# Altium footprint library myPcbLib.PcbLib: 987 footprints (part 3 of 62)
Each footprint in its own frame and in the unit in brackets; x right, y up, seen from the top. Pads: shape width x height; smd on the part's side, far side on the other; paste and mask are expansions set on the pad; w line width, h text height; cw(c..) or ccw(c..) is an arc to the next point about the centre after c.
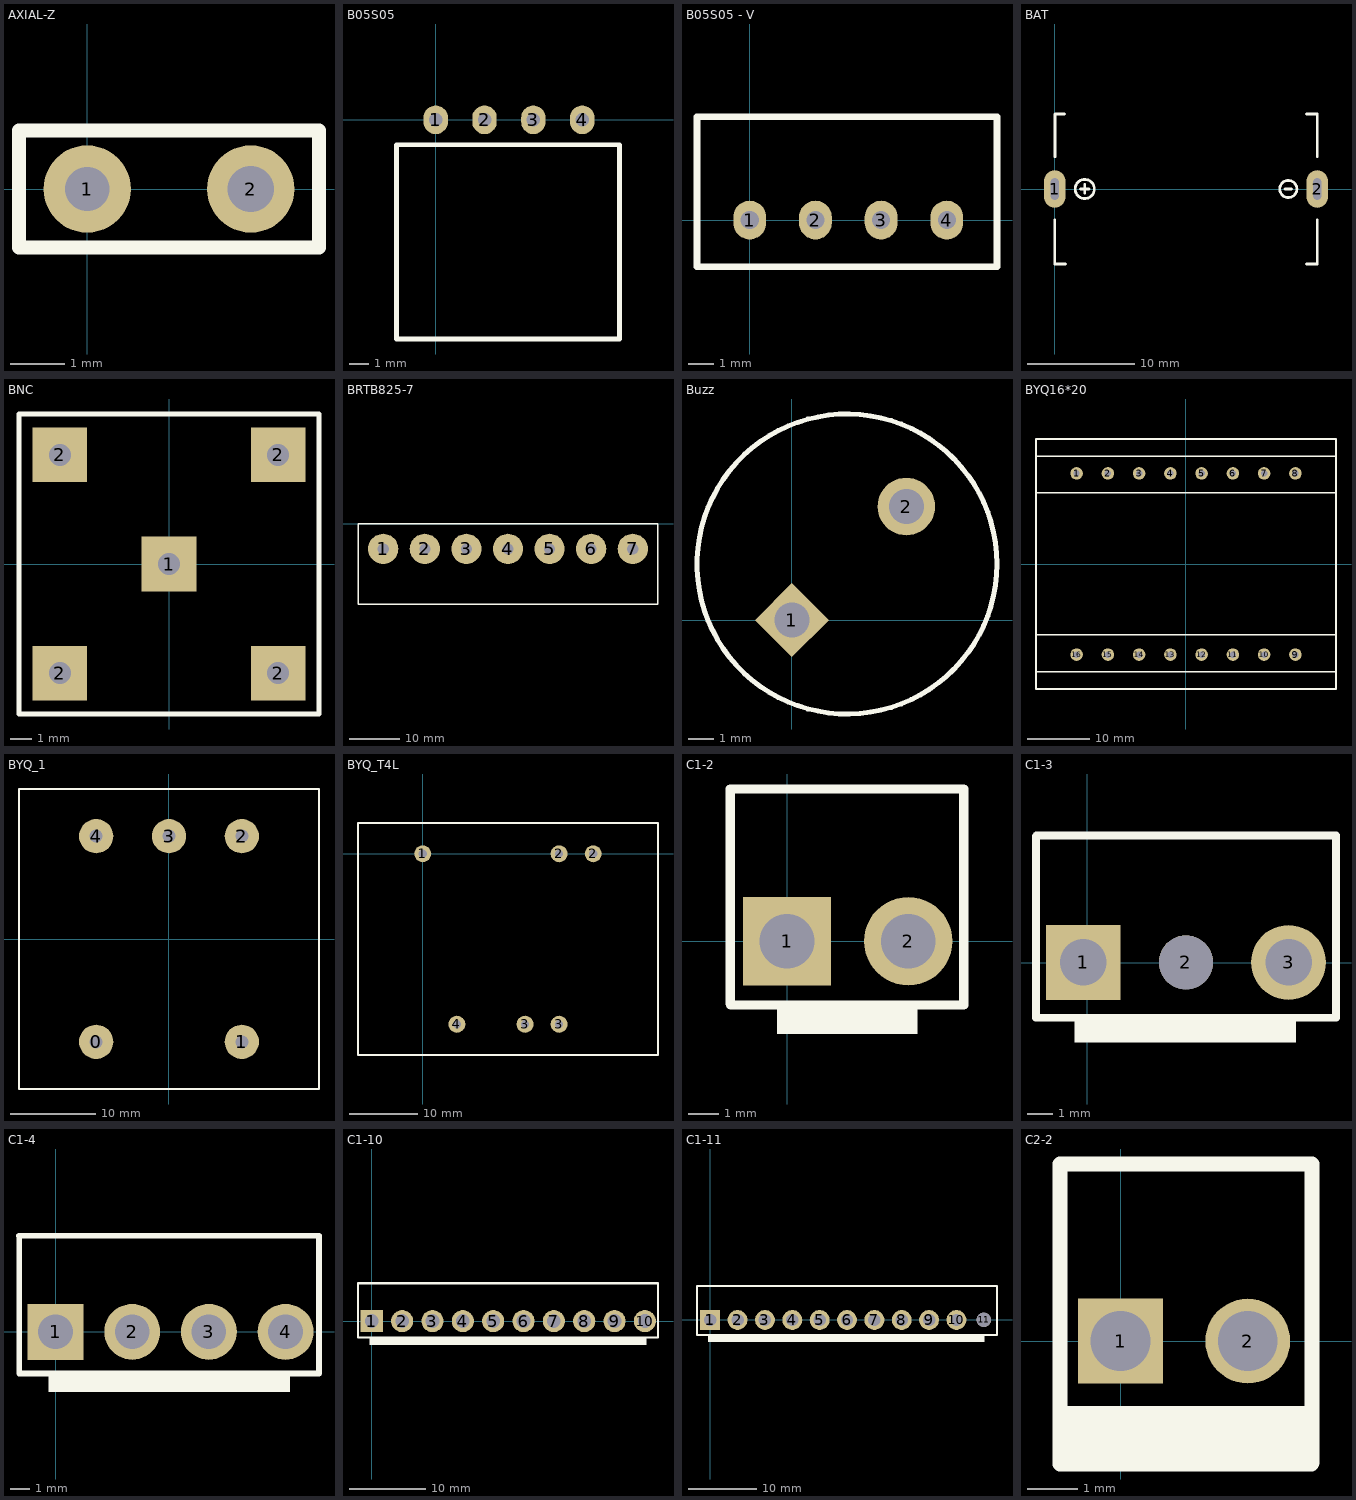
[diagram p2: the footprints below, top view; thin cyan lines are the x and y axes]

## AXIAL-Z [mm]
pads (2):
  round 1.6 hole 0.813: 1(0,0)
  round 1.6 hole 0.85: 2(3,0)
Top Overlay:
  lines w0.254: -1.25,-1.075 4.25,-1.075 4.25,1.075 -1.25,1.075 -1.25,-1.075

## B05S05 [mm]
height 8.2
pads (4):
  oval 1.27x1.5 hole 0.7: 1(0,0) 2(2.54,0) 3(5.08,0) 4(7.62,0)
Top Overlay:
  lines w0.254: -2.04,-11.4 9.56,-11.4 9.56,-1.3 -2.04,-1.3 -2.04,-11.4

## B05S05 - V [mm]
height 8.2
pads (4):
  oval 1.27x1.5 hole 0.7: 1(0,0) 2(2.54,0) 3(5.08,0) 4(7.62,0)
Top Overlay:
  lines w0.254: -2.04,-1.8 9.56,-1.8 9.56,4 -2.04,4 -2.04,-1.8

## BAT [mm]
pads (2):
  oval 2x3.5 hole 0.75 slot 2 at 90 deg: 1(0,0) 2(24.5,0)
Top Overlay:
  circle w0.254: c2.8,0 r0.894
  circle w0.254: c21.8,0 r0.8
  lines w0.254: 0,-2.9 0,-7 1,-7 ; 0.014,3.014 0.014,6.286 0.014,7 0.9,7 ; 2.4,0 3.2,0 ; 2.8,-0.386 2.8,0.414 ; 21.5,0 22.1,0 ; 23.5,-7 24.5,-7 24.5,-2.9 ; 23.5,7 24.5,7 24.5,3

## BNC [mil]
pads (5):
  rect 100x100 hole 40: 1(0,0) 2(-200,-200) 2(-200,200) 2(200,-200) 2(200,200)
Top Overlay:
  lines w10: -275,-275 275,-275 275,275 -275,275 -275,-275

## BRTB825-7 [mm]
height 13
pads (7):
  round 6 hole 2.2: 1(15,-5) 2(23.25,-5) 3(31.5,-5) 4(39.75,-5) 5(48,-5) 6(56.25,-5) 7(64.5,-5)
Top Overlay:
  lines w0.254: 10,-16 69.5,-16 69.5,0 10,0 10,-16

## Buzz [mm]
pads (2):
  rect 2.1x2.1 hole 1.4 rot 45: 1(0,0)
  round 2.3 hole 1.4: 2(4.572,4.54)
Top Overlay:
  circle w0.2: c2.201,2.244 r5.994

## BYQ16*20 [mm]
height 36
pads (16):
  round 2 hole 1: 1(-17.5,14.5) 2(-12.5,14.5) 3(-7.5,14.5) 4(-2.5,14.5) 5(2.5,14.5) 6(7.5,14.5) 7(12.5,14.5) 8(17.5,14.5) 9(17.5,-14.5) 10(12.5,-14.5) 11(7.5,-14.5) 12(2.5,-14.5) 13(-2.5,-14.5) 14(-7.5,-14.5) 15(-12.5,-14.5) 16(-17.5,-14.5)
Top Overlay:
  lines w0.254: -24,-17.272 23.873,-17.272 ; -24,11.43 23.873,11.43 ; -24,17.272 23.873,17.272 ; -23.873,-11.303 24,-11.303 ; -24,-20 -24,20 24,20 24,-20 -24,-20

## BYQ_1 [mm]
height 30
pads (5):
  round 4 hole 1.5: 0(-8.5,-12) 1(8.5,-12) 2(8.5,12) 3(0,12) 4(-8.5,12)
Top Overlay:
  lines w0.254: -17.5,-17.5 -17.5,17.5 17.5,17.5 17.5,-17.5 -17.5,-17.5

## BYQ_T4L [mm]
pads (6):
  round 2.5 hole 1.2: 1(0,0) 2(20,0) 2(25,0) 3(15,-25) 3(20,-25) 4(5,-25)
Top Overlay:
  lines w0.254: -9.5,-29.5 -9.5,0 -9.5,4.5 -5.5,4.5 34.5,4.5 34.5,-0.5 34.5,-29.5 25,-29.5 -9.5,-29.5

## C1-2 [mm]
pads (2):
  rect 2.9x2.9 hole 1.8: 1(0,0)
  round 2.9 hole 1.8: 2(3.98,0)
Top Overlay:
  region: 4.286,-3.048 4.286,-2.043 -0.328,-2.043 -0.328,-3.048
  lines w0.305: -1.863,-2.053 -1.863,4.995 5.8,4.995 5.8,-2.095 -1.852,-2.095

## C1-3 [mm]
pads (3):
  rect 2.9x2.9 hole 1.8: 1(-0.15,0.023)
  round 2.1 hole 2.1: 2(3.83,0.023)
  round 2.9 hole 1.8: 3(7.81,0.023)
Top Overlay:
  rectangle: -0.491,-3.076 8.092,-2.144
  lines w0.305: -1.983,4.915 -1.983,-2.123 9.648,-2.123 9.648,4.936 -1.962,4.936

## C1-4 [mm]
pads (4):
  rect 2.9x2.9 hole 1.8: 1(0,0)
  round 2.9 hole 1.8: 2(3.98,0) 3(7.96,0) 4(11.94,0)
Top Overlay:
  rectangle: -0.37,-3.133 12.181,-2.148
  lines w0.305: -1.894,4.985 13.674,4.985 13.674,-2.159 -1.884,-2.159 -1.884,4.889

## C1-10 [mm]
pads (10):
  rect 2.9x2.9 hole 1.8: 1(0,0)
  round 2.9 hole 1.8: 2(3.98,0) 3(7.96,0) 4(11.94,0) 5(15.92,0) 6(19.9,0) 7(23.88,0) 8(27.86,0) 9(31.84,0) 10(35.82,0)
Top Overlay:
  rectangle: -0.275,-3.122 36.015,-2.148
  lines w0.305: -1.81,4.911 -1.81,-2.148 37.539,-2.148 37.539,4.985 -1.789,4.985

## C1-11 [mm]
pads (11):
  rect 2.9x2.9 hole 1.8: 1(0,0)
  round 2.9 hole 1.8: 2(3.98,0) 3(7.96,0) 4(11.94,0) 5(15.92,0) 6(19.9,0) 7(23.88,0) 8(27.86,0) 9(31.84,0) 10(35.82,0)
  round 2.1 hole 2.1: 11(39.8,0)
Top Overlay:
  rectangle: -0.29,-3.183 39.884,-2.178
  lines w0.305: -1.92,4.86 -1.92,-2.178 41.715,-2.178 41.715,4.913 -1.899,4.913

## C2-2 [mm]
pads (2):
  rect 1.7x1.7 hole 1.2: 1(0,0)
  round 1.7 hole 1.2: 2(2.55,0)
Top Overlay:
  region: 3.794,-1.3 -1.201,-1.3 -1.201,-2.432 3.794,-2.432
  lines w0.305: 3.826,-2.464 -1.212,-2.464 -1.212,3.548 3.836,3.548 3.836,-2.432